# Altium footprint library ALL.PcbLib: 385 footprints (part 25 of 25)
Each footprint in its own frame and in the unit in brackets; x right, y up, seen from the top. Pads: shape width x height; smd on the part's side, far side on the other; paste and mask are expansions set on the pad; w line width, h text height; cw(c..) or ccw(c..) is an arc to the next point about the centre after c.
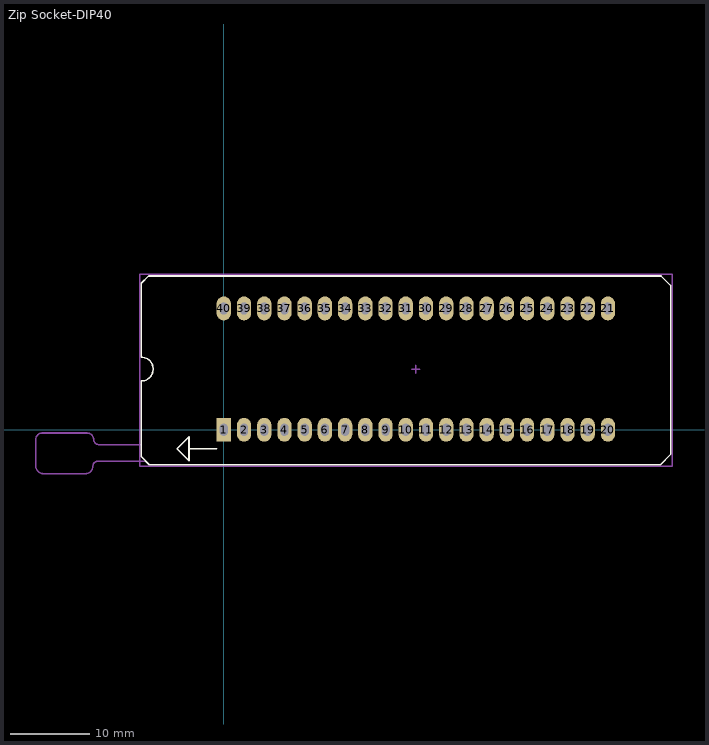
[diagram p24: the footprint, top view; thin cyan lines are the x and y axes]

## Zip Socket-DIP40 [mm]
pads (40):
  rect 1.8x3 hole 1 slot 1.5 at 90 deg mask+0.06: 1(0,0)
  oval 1.8x3 hole 1 slot 1.5 at 90 deg mask+0.06: 2(2.54,0) 3(5.08,0) 4(7.62,0) 5(10.16,0) 6(12.7,0) 7(15.24,0) 8(17.78,0) 9(20.32,0) 10(22.86,0) 11(25.4,0) 12(27.94,0) 13(30.48,0) 14(33.02,0) 15(35.56,0) 16(38.1,0) 17(40.64,0) 18(43.18,0) 19(45.72,0) 20(48.26,0) 21(48.26,15.24) 22(45.72,15.24) 23(43.18,15.24) 24(40.64,15.24) 25(38.1,15.24) 26(35.56,15.24) 27(33.02,15.24) 28(30.48,15.24) 29(27.94,15.24) 30(25.4,15.24) 31(22.86,15.24) 32(20.32,15.24) 33(17.78,15.24) 34(15.24,15.24) 35(12.7,15.24) 36(10.16,15.24) 37(7.62,15.24) 38(5.08,15.24) 39(2.54,15.24) 40(0,15.24)
Top Overlay:
  lines w0.2: -4.37,-2.38 -0.87,-2.38 ; -10.37,-3.372 -10.37,6.12 ccw(c-10.37,7.62) -10.37,9.12 -10.37,18.398 -9.448,19.32 54.938,19.32 56.13,18.128 56.13,-3.102 54.852,-4.38 -9.362,-4.38 -10.37,-3.372 ; -5.87,-2.38 -4.37,-3.88 -4.37,-0.88 -5.87,-2.38
Mechanical 13:
  lines w0.2: -10.37,-1.88 -15.665,-1.88 cw(c-15.665,-1.188) -16.358,-1.188 ccw(c-17.139,-1.188) -17.139,-0.406 -22.835,-0.406 ccw(c-22.835,-1.188) -23.616,-1.188 -23.616,-4.578 ccw(c-22.682,-4.578) -22.682,-5.512 -17.348,-5.512 ccw(c-17.348,-4.623) -16.459,-4.623 cw(c-15.773,-4.623) -15.773,-3.937 -10.005,-3.937
Mechanical 15:
  lines w0.2: 23.63,7.62 24.63,7.62 ; 24.13,7.12 24.13,8.12 ; -10.57,-4.58 -10.57,19.52 56.33,19.52 56.33,-4.58 -10.57,-4.58
3D body "Zif-Zip Socket.STEP": height 21.95, standoff -2.53, extent -17.449,-5.355 55.605,19.121